# Altium schematic symbol library GN-1846-E-V2_Library.SchLib: 99 symbols (part 1 of 7)
Pins are listed as number, name and electrical type; pins without a type are passive.

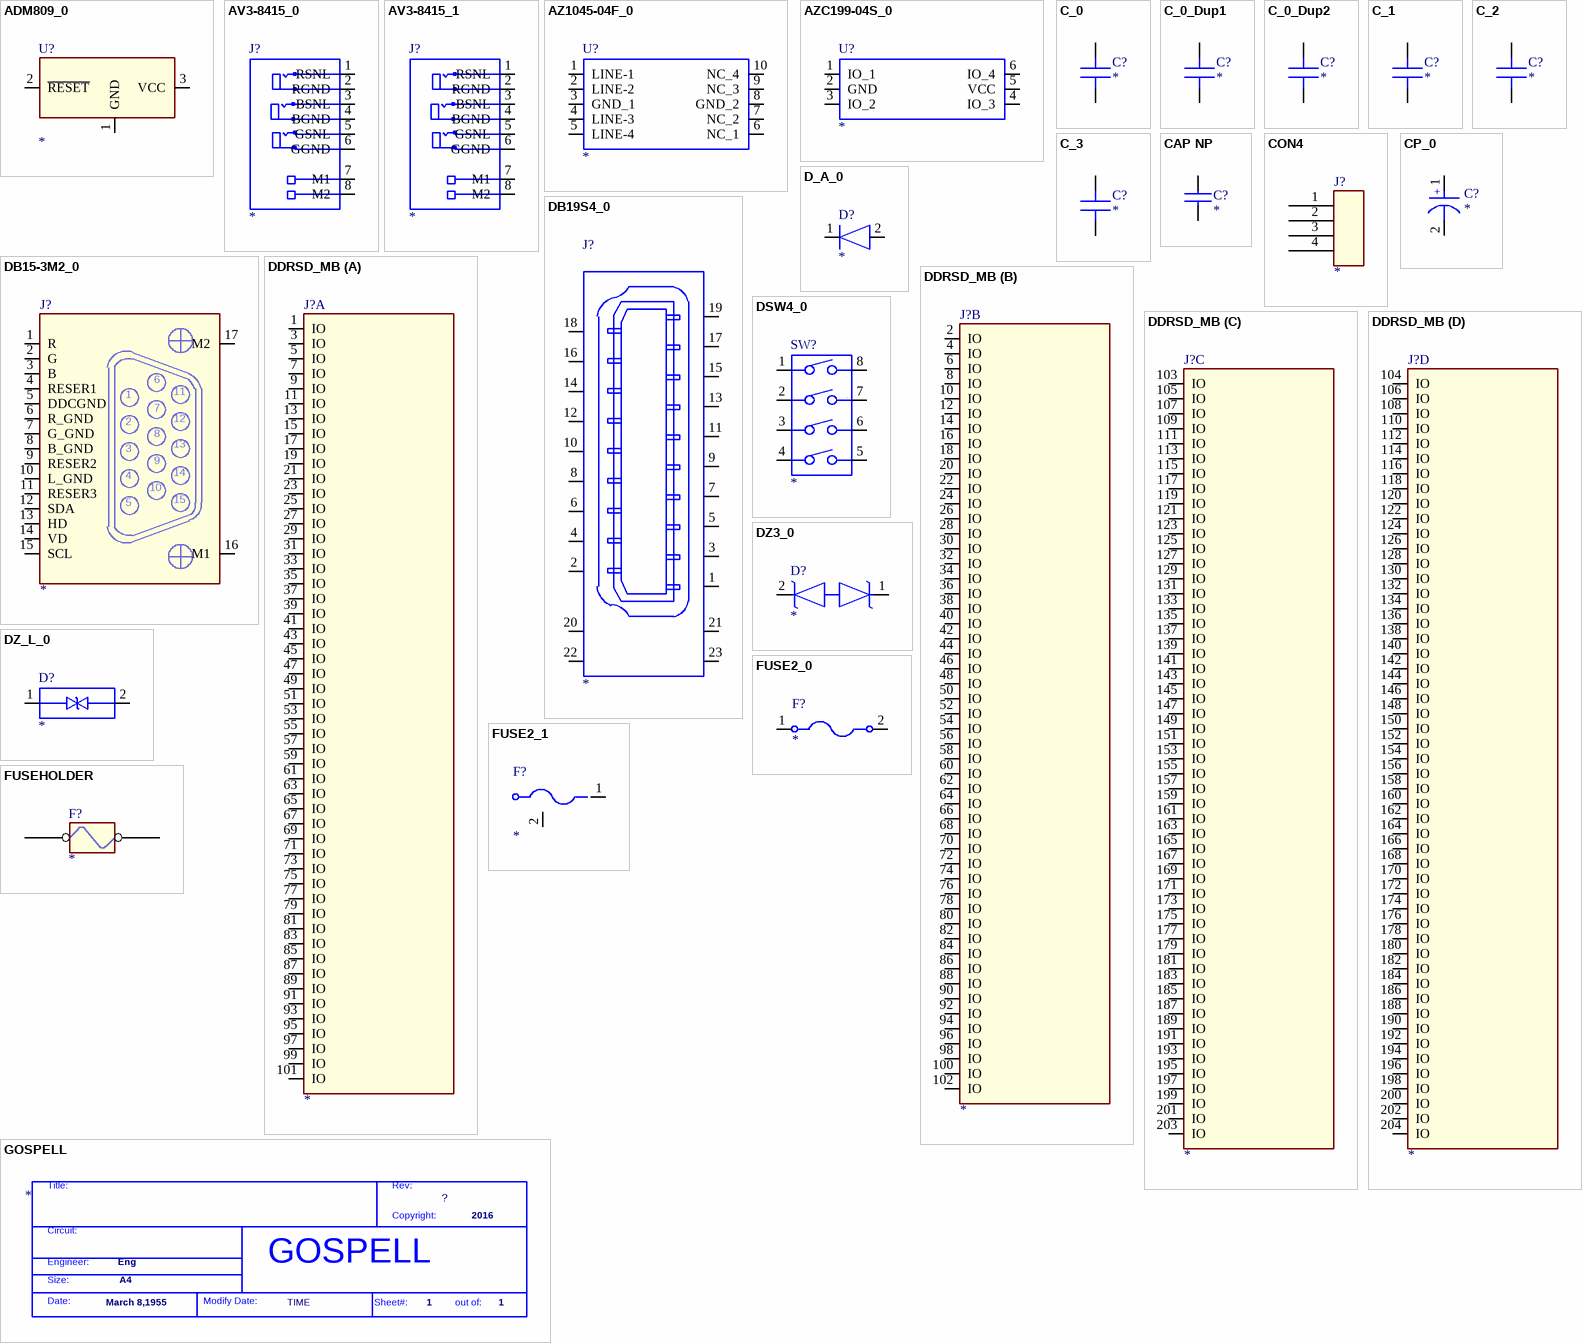
[diagram p0: symbols ADM809_0 to GOSPELL]

## ADM809_0
designator U?
PARTS: 1; DEVICE: ADM809; LEVEL: STD; PKG_TYPE: 3; CODE: 215838; OriginalSymbolOrigin: (10,60)
pins: 1 GND, 2 ~{RESET}, 3 VCC

## AV3-8415_0
designator J?
OriginalSymbolOrigin: (10,110); PKG_TYPE: 8; LEVEL: STD; CODE: 171865; DEVICE: AV3-8_4-15
pins: 1 RSNL, 2 RGND, 3 BSNL, 4 BGND, 5 GSNL, 6 GGND, 7 M1, 8 M2

## AV3-8415_1
designator J?
OriginalSymbolOrigin: (10,110); PKG_TYPE: 8; LEVEL: STD; CODE: 171865; DEVICE: AV3-8_4-15
pins: 1 RSNL, 2 RGND, 3 BSNL, 4 BGND, 5 GSNL, 6 GGND, 7 M1, 8 M2

## AZ1045-04F_0
designator U?
PARTS: 1; DEVICE: AZ1045-04F; LEVEL: STD; OriginalSymbolOrigin: (20,70)
pins: 1 LINE-1, 2 LINE-2, 3 GND_1, 4 LINE-3, 5 LINE-4, 6 NC_1, 7 NC_2, 8 GND_2, 9 NC_3, 10 NC_4

## AZC199-04S_0
designator U?
PARTS: 1; DEVICE: AZC199-04S; LEVEL: STD; OriginalSymbolOrigin: (20,50)
pins: 1 IO_1, 2 GND, 3 IO_2, 4 IO_3, 5 VCC, 6 IO_4

## C_0
designator C?
PARTS: 1; OriginalSymbolOrigin: (0,30); DEVICE: CP; PKG_TYPE: CAP2-100-250; LEVEL: STD; PINSWAP: (A,B)
pins: 1 A, 2 B

## C_0_Dup1
designator C?
PARTS: 1; OriginalSymbolOrigin: (0,30); DEVICE: CP; PKG_TYPE: CAP2-100-250; LEVEL: STD; PINSWAP: (A,B)
pins: 1 A, 2 B

## C_0_Dup2
designator C?
PARTS: 1; PINSWAP: (A,B); LEVEL: STD; PKG_TYPE: CAP2-100-250; DEVICE: CP; OriginalSymbolOrigin: (0,30)
pins: 1 A, 2 B

## C_1
designator C?
PARTS: 1; PINSWAP: (A,B); LEVEL: STD; PKG_TYPE: CAP2-100-250; DEVICE: CP; OriginalSymbolOrigin: (0,30)
pins: 1 A, 2 B

## C_2
designator C?
PARTS: 1; PINSWAP: (A,B); LEVEL: STD; PKG_TYPE: CAP2-100-250; DEVICE: CP; OriginalSymbolOrigin: (0,30)
pins: 1 A, 2 B

## C_3
designator C?
PARTS: 1; OriginalSymbolOrigin: (0,30); DEVICE: CP; PKG_TYPE: CAP2-100-250; LEVEL: STD; PINSWAP: (A,B)
pins: 1 A, 2 B

## CAP NP
designator C?
pins: 1, 2

## CON4
designator J?
pins: 1, 2, 3, 4

## CP_0
designator C?
PARTS: 1; LEVEL: STD; PKG_TYPE: CAP2-100-250; DEVICE: CP; OriginalSymbolOrigin: (0,30)
pins: 1, 2
text: +

## D_A_0
designator D?
PARTS: 1; DEVICE: 1PS79SB31; LEVEL: STD; OriginalSymbolOrigin: (20,20); PKG_TYPE: ?; CODE: ?
pins: 1 K, 2 A

## DB15-3M2_0
designator J?
PARTS: 1; DEVICE: DB15-3M2; LEVEL: STD; PKG_TYPE: 17; CODE: 136050; OriginalSymbolOrigin: (20,200)
pins: 1 R, 2 G, 3 B, 4 RESER1, 5 DDCGND, 6 R_GND, 7 G_GND, 8 B_GND, 9 RESER2, 10 L_GND, 11 RESER3, 12 SDA, 13 HD, 14 VD, 15 SCL, 16 M1, 17 M2

## DB19S4_0
designator J?
PARTS: 1; DEVICE: 1734011-1; LEVEL: STD; PKG_TYPE: 23; CODE: 168084; OriginalSymbolOrigin: (20,280)
pins: 1 P1, 2 P2, 3 P3, 4 P4, 5 P5, 6 P6, 7 P7, 8 P8, 9 P9, 10 P10, 11 P11, 12 P12, 13 P13, 14 P14, 15 P15, 16 P16, 17 P17, 18 P18, 19 P19, 20 S20, 21 S21, 22 S22, 23 S23

## DDRSD_MB
designator J?
SWAP_INFO: (S1+S2+S3+S4); SPLIT_INST: TRUE
part A pins: 1 IO, 3 IO, 5 IO, 7 IO, 9 IO, 11 IO, 13 IO, 15 IO, 17 IO, 19 IO, 21 IO, 23 IO, 25 IO, 27 IO, 29 IO, 31 IO, 33 IO, 35 IO, 37 IO, 39 IO, 41 IO, 43 IO, 45 IO, 47 IO, 49 IO, 51 IO, 53 IO, 55 IO, 57 IO, 59 IO, 61 IO, 63 IO, 65 IO, 67 IO, 69 IO, 71 IO, 73 IO, 75 IO, 77 IO, 79 IO, 81 IO, 83 IO, 85 IO, 87 IO, 89 IO, 91 IO, 93 IO, 95 IO, 97 IO, 99 IO, 101 IO
part B pins: 2 IO, 4 IO, 6 IO, 8 IO, 10 IO, 12 IO, 14 IO, 16 IO, 18 IO, 20 IO, 22 IO, 24 IO, 26 IO, 28 IO, 30 IO, 32 IO, 34 IO, 36 IO, 38 IO, 40 IO, 42 IO, 44 IO, 46 IO, 48 IO, 50 IO, 52 IO, 54 IO, 56 IO, 58 IO, 60 IO, 62 IO, 64 IO, 66 IO, 68 IO, 70 IO, 72 IO, 74 IO, 76 IO, 78 IO, 80 IO, 82 IO, 84 IO, 86 IO, 88 IO, 90 IO, 92 IO, 94 IO, 96 IO, 98 IO, 100 IO, 102 IO
part C pins: 103 IO, 105 IO, 107 IO, 109 IO, 111 IO, 113 IO, 115 IO, 117 IO, 119 IO, 121 IO, 123 IO, 125 IO, 127 IO, 129 IO, 131 IO, 133 IO, 135 IO, 137 IO, 139 IO, 141 IO, 143 IO, 145 IO, 147 IO, 149 IO, 151 IO, 153 IO, 155 IO, 157 IO, 159 IO, 161 IO, 163 IO, 165 IO, 167 IO, 169 IO, 171 IO, 173 IO, 175 IO, 177 IO, 179 IO, 181 IO, 183 IO, 185 IO, 187 IO, 189 IO, 191 IO, 193 IO, 195 IO, 197 IO, 199 IO, 201 IO, 203 IO
part D pins: 104 IO, 106 IO, 108 IO, 110 IO, 112 IO, 114 IO, 116 IO, 118 IO, 120 IO, 122 IO, 124 IO, 126 IO, 128 IO, 130 IO, 132 IO, 134 IO, 136 IO, 138 IO, 140 IO, 142 IO, 144 IO, 146 IO, 148 IO, 150 IO, 152 IO, 154 IO, 156 IO, 158 IO, 160 IO, 162 IO, 164 IO, 166 IO, 168 IO, 170 IO, 172 IO, 174 IO, 176 IO, 178 IO, 180 IO, 182 IO, 184 IO, 186 IO, 188 IO, 190 IO, 192 IO, 194 IO, 196 IO, 198 IO, 200 IO, 202 IO, 204 IO

## DSW4_0
designator SW?
PARTS: 1; DEVICE: GSW3; LEVEL: STD; PKG_TYPE: SDSW8-L; CODE: 16070017; OriginalSymbolOrigin: (20,100)
pins: 1, 2, 3, 4, 5, 6, 7, 8

## DZ3_0
designator D?
PARTS: 1; OriginalSymbolOrigin: (20,20); CODE: 15040194; PKG_TYPE: DO-214AA-DI; LEVEL: STD; DEVICE: 1N5231BRL
pins: 1 A, 2 B

## DZ_L_0
designator D?
PARTS: 1; DEVICE: AKSMT15-076C; LEVEL: STD; OriginalSymbolOrigin: (20,30)
pins: 1, 2

## FUSE2_0
designator F?
PARTS: 1; OriginalSymbolOrigin: (20,20); LEVEL: STD; DEVICE: FUSE; CODE: ?; PKG_TYPE: ?
pins: 1 P1, 2 P2

## FUSE2_1
designator F?
PARTS: 1; DEVICE: FUSE; LEVEL: STD; OriginalSymbolOrigin: (20,20); PKG_TYPE: ?; CODE: ?
pins: 1 P1, 2 P2

## FUSEHOLDER
designator F?
pins: 1, 2

## GOSPELL
designator *  Page Modify Date: TIME  Engineer: Eng  Copyright: 2016  Page Size: A4  Page Create Date: March 8,1955  Page Number: 1  (graphical)
RevCode: ?; Page Count: 1
text: Title:; Rev:; Copyright:; Circuit:; Engineer:; Size:; Date:; Modify Date:; Sheet#:; out of:

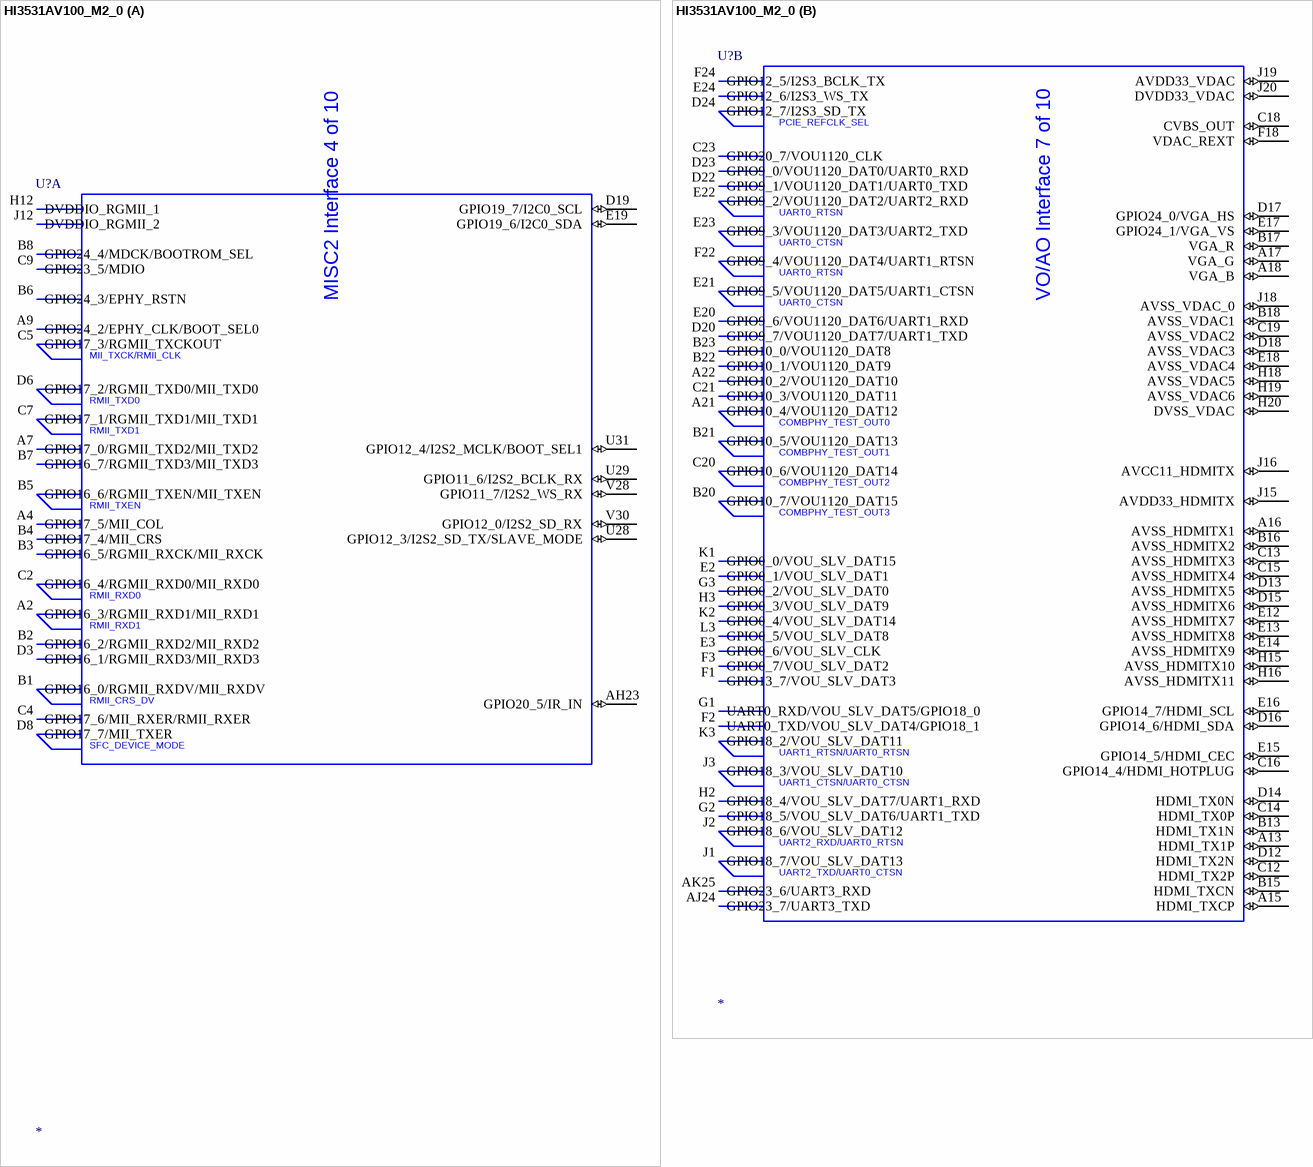
[diagram p1: symbol HI3531AV100_M2_0]

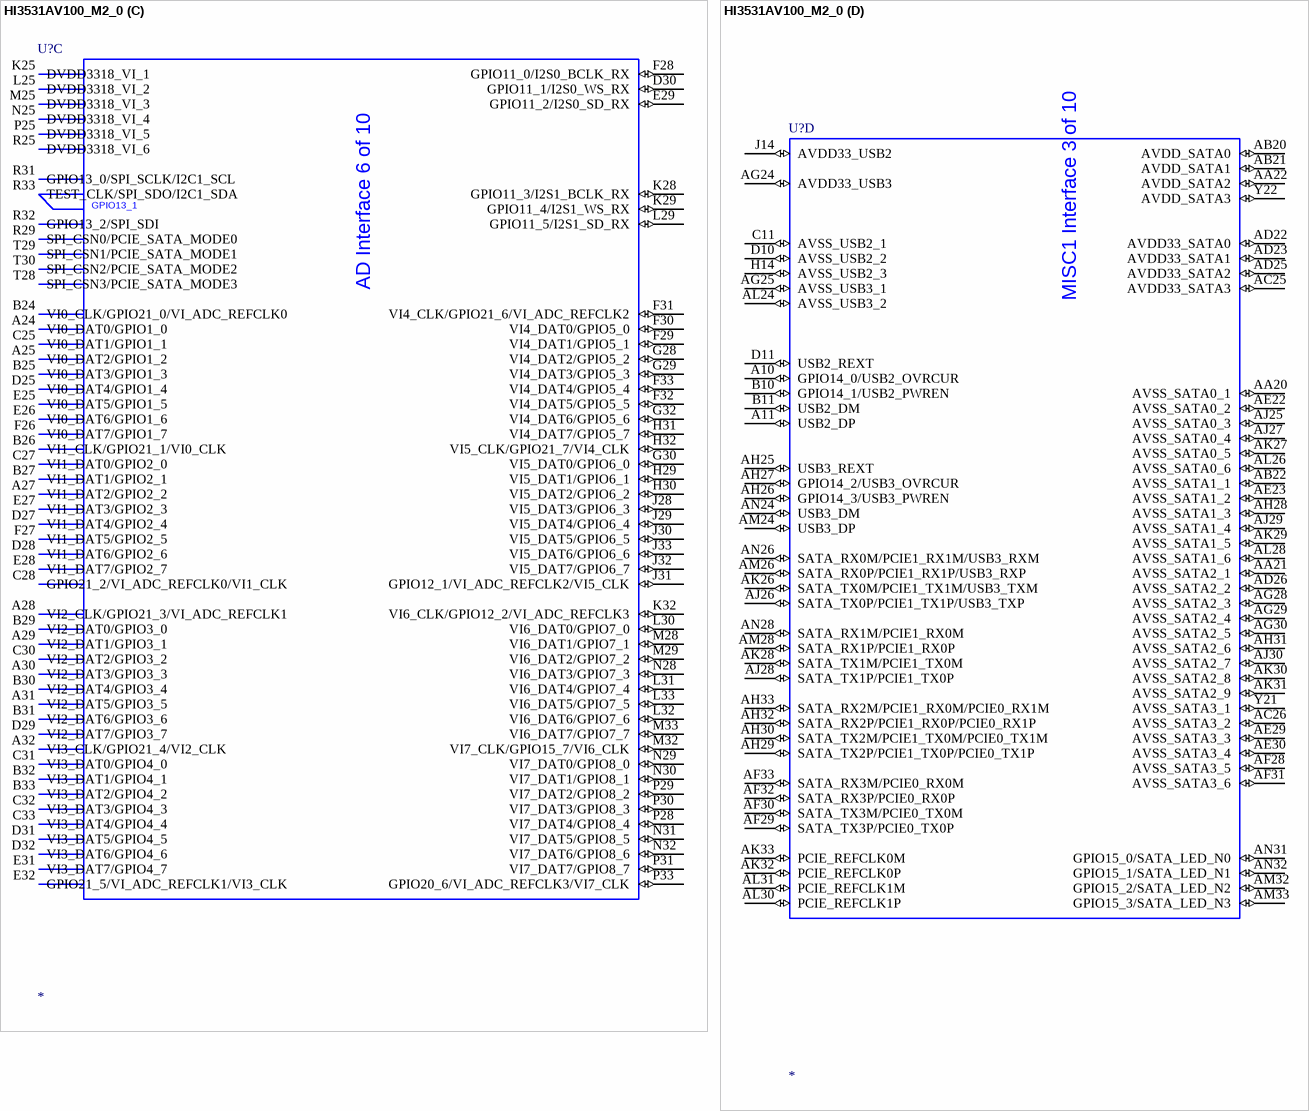
[diagram p2: symbol HI3531AV100_M2_0]

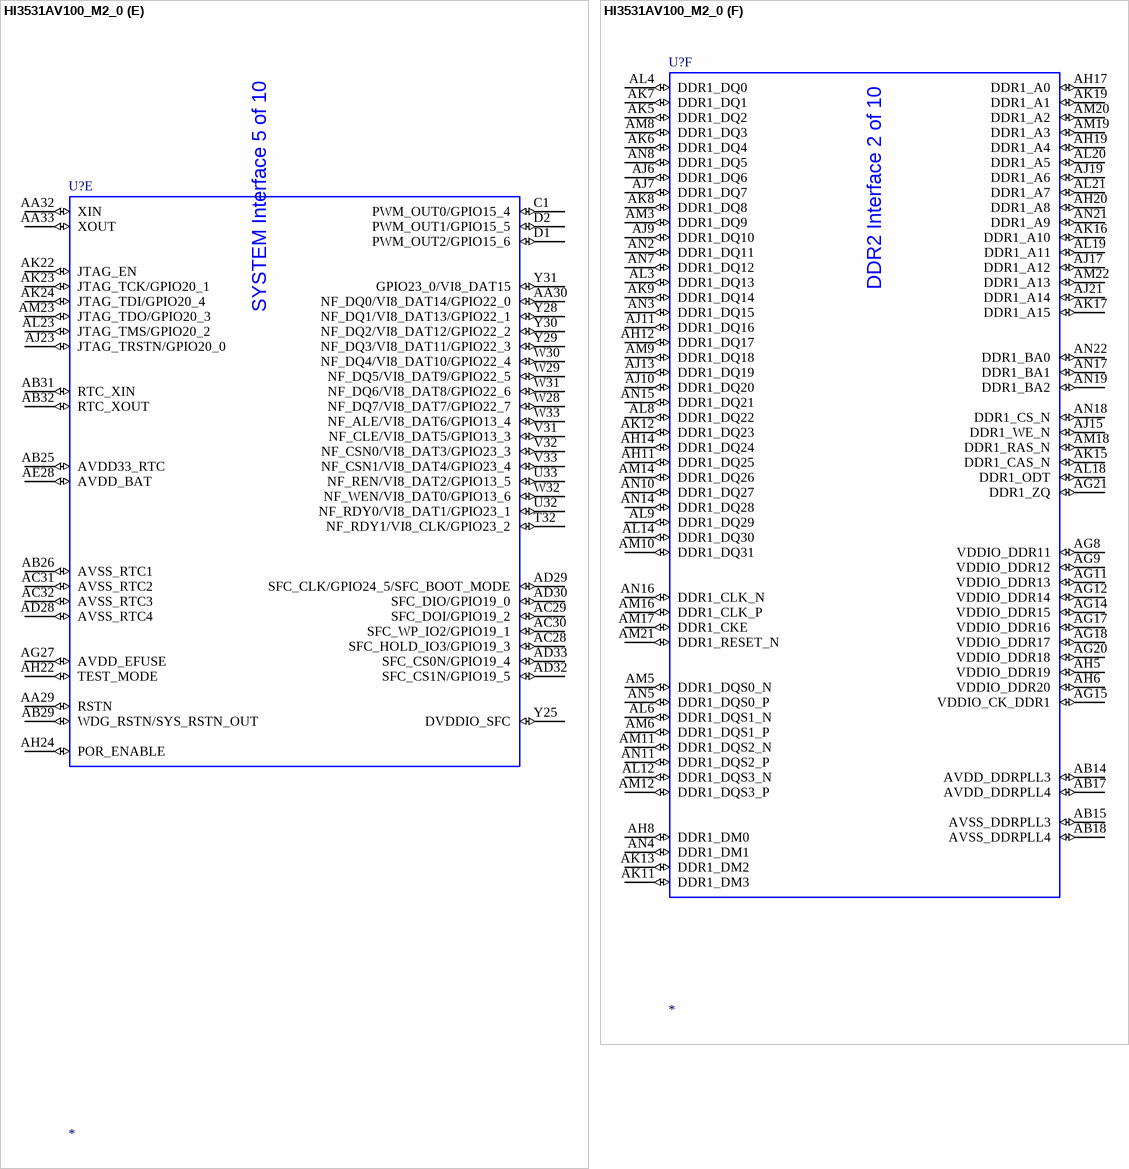
[diagram p3: symbol HI3531AV100_M2_0]

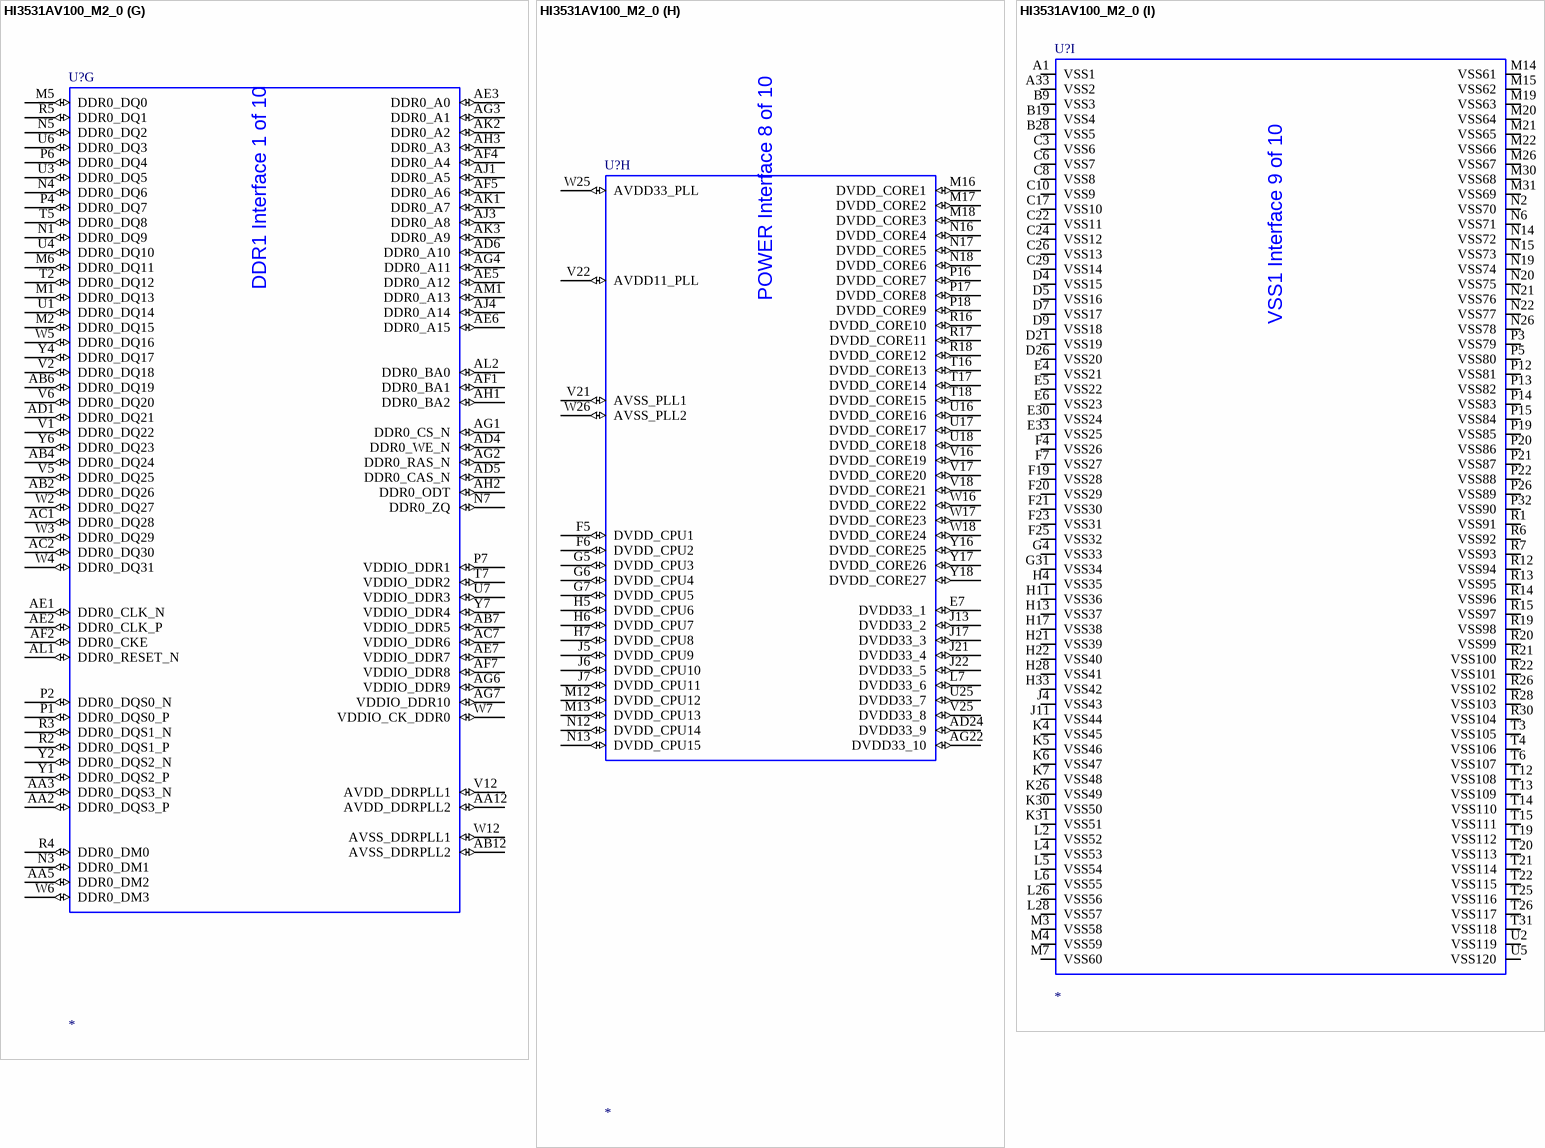
[diagram p4: symbol HI3531AV100_M2_0]

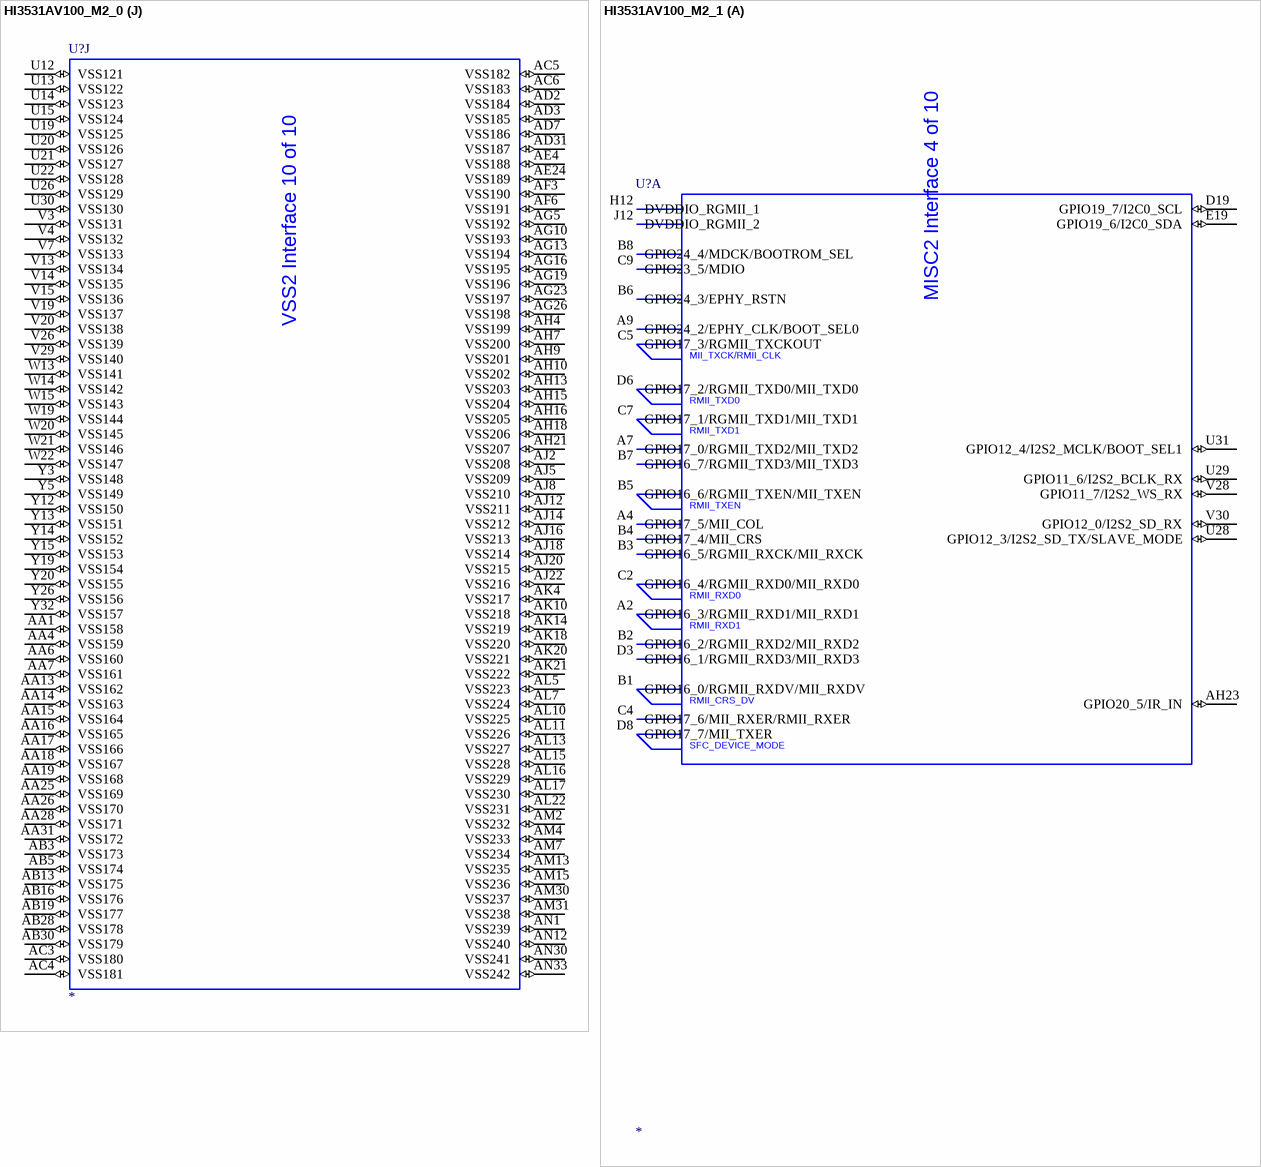
[diagram p5: symbols HI3531AV100_M2_0 to HI3531AV100_M2_1]

## HI3531AV100_M2_0
designator U?
PARTS: 1; OriginalSymbolOrigin: (30,630); LEVEL: STD; DEVICE: HI3531AV100; HETERO: (HI3531AV100_DDR1),(HI3531AV100_DDR2),(HI3531AV100_SYSTEM),(HI3531AV100_AD),(HI3531AV100_VO),(HI3531AV100_M1),(HI3531AV100_M2),(HI3531AV100_POWER),(HI3531AV100_VSS1),(HI3531AV100_VSS2); FORWARD_PCB: 1
part A pins: A2 GPIO16_3/RGMII_RXD1/MII_RXD1 (io), A4 GPIO17_5/MII_COL (io), A7 GPIO17_0/RGMII_TXD2/MII_TXD2 (io), A9 GPIO24_2/EPHY_CLK/BOOT_SEL0 (io), AH23 GPIO20_5/IR_IN (io), B1 GPIO16_0/RGMII_RXDV/MII_RXDV (io), B2 GPIO16_2/RGMII_RXD2/MII_RXD2 (io), B3 GPIO16_5/RGMII_RXCK/MII_RXCK (io), B4 GPIO17_4/MII_CRS (io), B5 GPIO16_6/RGMII_TXEN/MII_TXEN (io), B6 GPIO24_3/EPHY_RSTN (io), B7 GPIO16_7/RGMII_TXD3/MII_TXD3 (io), B8 GPIO24_4/MDCK/BOOTROM_SEL (io), C2 GPIO16_4/RGMII_RXD0/MII_RXD0 (io), C4 GPIO17_6/MII_RXER/RMII_RXER (io), C5 GPIO17_3/RGMII_TXCKOUT (io), C7 GPIO17_1/RGMII_TXD1/MII_TXD1 (io), C9 GPIO23_5/MDIO (io), D3 GPIO16_1/RGMII_RXD3/MII_RXD3 (io), D6 GPIO17_2/RGMII_TXD0/MII_TXD0 (io), D8 GPIO17_7/MII_TXER (io), D19 GPIO19_7/I2C0_SCL (io), E19 GPIO19_6/I2C0_SDA (io), H12 DVDDIO_RGMII_1 (io), J12 DVDDIO_RGMII_2 (io), U28 GPIO12_3/I2S2_SD_TX/SLAVE_MODE (io), U29 GPIO11_6/I2S2_BCLK_RX (io), U31 GPIO12_4/I2S2_MCLK/BOOT_SEL1 (io), V28 GPIO11_7/I2S2_WS_RX (io), V30 GPIO12_0/I2S2_SD_RX (io)
part B pins: A13 HDMI_TX1P (io), A15 HDMI_TXCP (io), A16 AVSS_HDMITX1 (io), A17 VGA_G (io), A18 VGA_B (io), A21 GPIO10_4/VOU1120_DAT12 (io), A22 GPIO10_2/VOU1120_DAT10 (io), AJ24 GPIO23_7/UART3_TXD (io), AK25 GPIO23_6/UART3_RXD (io), B13 HDMI_TX1N (io), B15 HDMI_TXCN (io), B16 AVSS_HDMITX2 (io), B17 VGA_R (io), B18 AVSS_VDAC1 (io), B20 GPIO10_7/VOU1120_DAT15 (io), B21 GPIO10_5/VOU1120_DAT13 (io), B22 GPIO10_1/VOU1120_DAT9 (io), B23 GPIO10_0/VOU1120_DAT8 (io), C12 HDMI_TX2P (io), C13 AVSS_HDMITX3 (io), C14 HDMI_TX0P (io), C15 AVSS_HDMITX4 (io), C16 GPIO14_4/HDMI_HOTPLUG (io), C18 CVBS_OUT (io), C19 AVSS_VDAC2 (io), C20 GPIO10_6/VOU1120_DAT14 (io), C21 GPIO10_3/VOU1120_DAT11 (io), C23 GPIO20_7/VOU1120_CLK (io), D12 HDMI_TX2N (io), D13 AVSS_HDMITX5 (io), D14 HDMI_TX0N (io), D15 AVSS_HDMITX6 (io), D16 GPIO14_6/HDMI_SDA (io), D17 GPIO24_0/VGA_HS (io), D18 AVSS_VDAC3 (io), D20 GPIO9_7/VOU1120_DAT7/UART1_TXD (io), D22 GPIO9_1/VOU1120_DAT1/UART0_TXD (io), D23 GPIO9_0/VOU1120_DAT0/UART0_RXD (io), D24 GPIO12_7/I2S3_SD_TX (io), E2 GPIO0_1/VOU_SLV_DAT1 (io), E3 GPIO0_6/VOU_SLV_CLK (io), E12 AVSS_HDMITX7 (io), E13 AVSS_HDMITX8 (io), E14 AVSS_HDMITX9 (io), E15 GPIO14_5/HDMI_CEC (io), E16 GPIO14_7/HDMI_SCL (io), E17 GPIO24_1/VGA_VS (io), E18 AVSS_VDAC4 (io), E20 GPIO9_6/VOU1120_DAT6/UART1_RXD (io), E21 GPIO9_5/VOU1120_DAT5/UART1_CTSN (io), E22 GPIO9_2/VOU1120_DAT2/UART2_RXD (io), E23 GPIO9_3/VOU1120_DAT3/UART2_TXD (io), E24 GPIO12_6/I2S3_WS_TX (io), F1 GPIO13_7/VOU_SLV_DAT3 (io), F2 UART0_TXD/VOU_SLV_DAT4/GPIO18_1 (io), F3 GPIO0_7/VOU_SLV_DAT2 (io), F18 VDAC_REXT (io), F22 GPIO9_4/VOU1120_DAT4/UART1_RTSN (io), F24 GPIO12_5/I2S3_BCLK_TX (io), G1 UART0_RXD/VOU_SLV_DAT5/GPIO18_0 (io), G2 GPIO18_5/VOU_SLV_DAT6/UART1_TXD (io), G3 GPIO0_2/VOU_SLV_DAT0 (io), H2 GPIO18_4/VOU_SLV_DAT7/UART1_RXD (io), H3 GPIO0_3/VOU_SLV_DAT9 (io), H15 AVSS_HDMITX10 (io), H16 AVSS_HDMITX11 (io), H18 AVSS_VDAC5 (io), H19 AVSS_VDAC6 (io), H20 DVSS_VDAC (io), J1 GPIO18_7/VOU_SLV_DAT13 (io), J2 GPIO18_6/VOU_SLV_DAT12 (io), J3 GPIO18_3/VOU_SLV_DAT10 (io), J15 AVDD33_HDMITX (io), J16 AVCC11_HDMITX (io), J18 AVSS_VDAC_0 (io), J19 AVDD33_VDAC (io), J20 DVDD33_VDAC (io), K1 GPIO0_0/VOU_SLV_DAT15 (io), K2 GPIO0_4/VOU_SLV_DAT14 (io), K3 GPIO18_2/VOU_SLV_DAT11 (io), L3 GPIO0_5/VOU_SLV_DAT8 (io)
part C pins: A24 VI0_DAT0/GPIO1_0 (io), A25 VI0_DAT2/GPIO1_2 (io), A27 VI1_DAT2/GPIO2_2 (io), A28 VI2_CLK/GPIO21_3/VI_ADC_REFCLK1 (io), A29 VI2_DAT1/GPIO3_1 (io), A30 VI2_DAT3/GPIO3_3 (io), A31 VI2_DAT5/GPIO3_5 (io), A32 VI3_CLK/GPIO21_4/VI2_CLK (io), B24 VI0_CLK/GPIO21_0/VI_ADC_REFCLK0 (io), B25 VI0_DAT3/GPIO1_3 (io), B26 VI1_CLK/GPIO21_1/VI0_CLK (io), B27 VI1_DAT1/GPIO2_1 (io), B29 VI2_DAT0/GPIO3_0 (io), B30 VI2_DAT4/GPIO3_4 (io), B31 VI2_DAT6/GPIO3_6 (io), B32 VI3_DAT1/GPIO4_1 (io), B33 VI3_DAT2/GPIO4_2 (io), C25 VI0_DAT1/GPIO1_1 (io), C27 VI1_DAT0/GPIO2_0 (io), C28 GPIO21_2/VI_ADC_REFCLK0/VI1_CLK (io), C30 VI2_DAT2/GPIO3_2 (io), C31 VI3_DAT0/GPIO4_0 (io), C32 VI3_DAT3/GPIO4_3 (io), C33 VI3_DAT4/GPIO4_4 (io), D25 VI0_DAT4/GPIO1_4 (io), D27 VI1_DAT4/GPIO2_4 (io), D28 VI1_DAT6/GPIO2_6 (io), D29 VI2_DAT7/GPIO3_7 (io), D30 GPIO11_1/I2S0_WS_RX (io), D31 VI3_DAT5/GPIO4_5 (io), D32 VI3_DAT6/GPIO4_6 (io), E25 VI0_DAT5/GPIO1_5 (io), E26 VI0_DAT6/GPIO1_6 (io), E27 VI1_DAT3/GPIO2_3 (io), E28 VI1_DAT7/GPIO2_7 (io), E29 GPIO11_2/I2S0_SD_RX (io), E31 VI3_DAT7/GPIO4_7 (io), E32 GPIO21_5/VI_ADC_REFCLK1/VI3_CLK (io), F26 VI0_DAT7/GPIO1_7 (io), F27 VI1_DAT5/GPIO2_5 (io), F28 GPIO11_0/I2S0_BCLK_RX (io), F29 VI4_DAT1/GPIO5_1 (io), F30 VI4_DAT0/GPIO5_0 (io), F31 VI4_CLK/GPIO21_6/VI_ADC_REFCLK2 (io), F32 VI4_DAT5/GPIO5_5 (io), F33 VI4_DAT4/GPIO5_4 (io), G28 VI4_DAT2/GPIO5_2 (io), G29 VI4_DAT3/GPIO5_3 (io), G30 VI5_DAT0/GPIO6_0 (io), G32 VI4_DAT6/GPIO5_6 (io), H29 VI5_DAT1/GPIO6_1 (io), H30 VI5_DAT2/GPIO6_2 (io), H31 VI4_DAT7/GPIO5_7 (io), H32 VI5_CLK/GPIO21_7/VI4_CLK (io), J28 VI5_DAT3/GPIO6_3 (io), J29 VI5_DAT4/GPIO6_4 (io), J30 VI5_DAT5/GPIO6_5 (io), J31 GPIO12_1/VI_ADC_REFCLK2/VI5_CLK (io), J32 VI5_DAT7/GPIO6_7 (io), J33 VI5_DAT6/GPIO6_6 (io), K25 DVDD3318_VI_1 (io), K28 GPIO11_3/I2S1_BCLK_RX (io), K29 GPIO11_4/I2S1_WS_RX (io), K32 VI6_CLK/GPIO12_2/VI_ADC_REFCLK3 (io), L25 DVDD3318_VI_2 (io), L29 GPIO11_5/I2S1_SD_RX (io), L30 VI6_DAT0/GPIO7_0 (io), L31 VI6_DAT4/GPIO7_4 (io), L32 VI6_DAT6/GPIO7_6 (io), L33 VI6_DAT5/GPIO7_5 (io), M25 DVDD3318_VI_3 (io), M28 VI6_DAT1/GPIO7_1 (io), M29 VI6_DAT2/GPIO7_2 (io), M32 VI7_CLK/GPIO15_7/VI6_CLK (io), M33 VI6_DAT7/GPIO7_7 (io), N25 DVDD3318_VI_4 (io), N28 VI6_DAT3/GPIO7_3 (io), N29 VI7_DAT0/GPIO8_0 (io), N30 VI7_DAT1/GPIO8_1 (io), N31 VI7_DAT5/GPIO8_5 (io), N32 VI7_DAT6/GPIO8_6 (io), P25 DVDD3318_VI_5 (io), P28 VI7_DAT4/GPIO8_4 (io), P29 VI7_DAT2/GPIO8_2 (io), P30 VI7_DAT3/GPIO8_3 (io), P31 VI7_DAT7/GPIO8_7 (io), P33 GPIO20_6/VI_ADC_REFCLK3/VI7_CLK (io), R25 DVDD3318_VI_6 (io), R29 SPI_CSN0/PCIE_SATA_MODE0 (io), R31 GPIO13_0/SPI_SCLK/I2C1_SCL (io), R32 GPIO13_2/SPI_SDI (io), R33 TEST_CLK/SPI_SDO/I2C1_SDA (io), T28 SPI_CSN3/PCIE_SATA_MODE3 (io), T29 SPI_CSN1/PCIE_SATA_MODE1 (io), T30 SPI_CSN2/PCIE_SATA_MODE2 (io)